# Altium footprint library 15-LEDs+LCD.PcbLib: 116 footprints (part 7 of 8)
Each footprint in its own frame and in the unit in brackets; x right, y up, seen from the top. Pads: shape width x height; smd on the part's side, far side on the other; paste and mask are expansions set on the pad; w line width, h text height; cw(c..) or ccw(c..) is an arc to the next point about the centre after c.
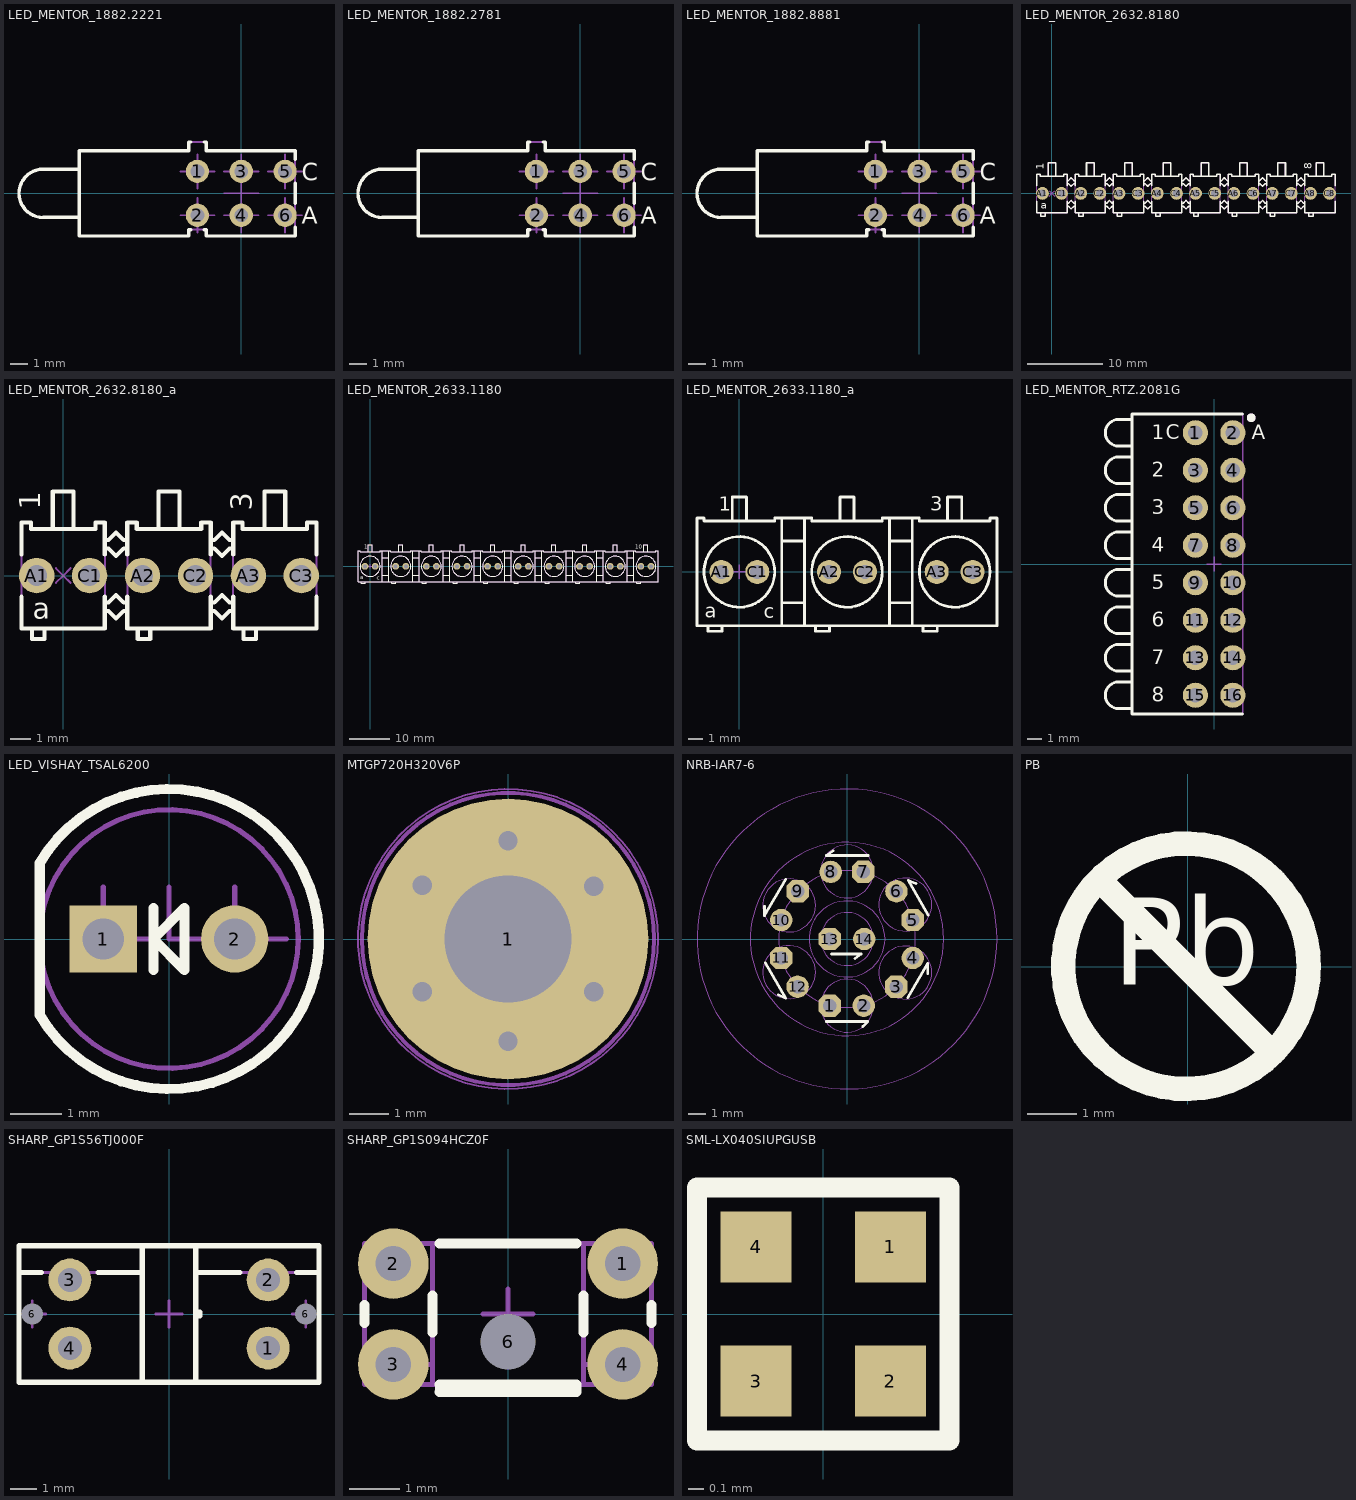
[diagram p6: the footprints below, top view; thin cyan lines are the x and y axes]

## LED_MENTOR_1882.2221 [mm] "3x Red LED 3mm PCB Edge Mounting MENTOR 1882.2221"
height 12
pads (6):
  round 1.35 hole 0.8: 1(-2.54,1.27) 2(-2.54,-1.27) 3(0,1.27) 4(0,-1.27) 5(2.54,1.27) 6(2.54,-1.27)
Top Overlay:
  lines w0.2: -9.38,-1.4 -11.48,-1.4 cw(c-11.48,0) -11.48,1.4 -9.38,1.4 ; -2.93,-2.1 -3.04,-2.1 -3.04,-2.475 -9.38,-2.475 -9.38,2.475 -3.04,2.475 -3.04,2.975 -2.93,2.975 ; -2.15,-2.1 -2.04,-2.1 -2.04,-2.475 3.12,-2.475 3.12,-1.958 ; -2.15,2.975 -2.04,2.975 -2.04,2.475 3.12,2.475 3.12,1.958 ; 3.12,-0.582 3.12,0.582
  text "C" at 3.505,0.762 h1
  text "A" at 3.505,-1.778 h1
Mechanical 8:
  lines w0.1: -3.54,-1.27 -2.54,-1.27 ; -3.54,1.27 -2.54,1.27 ; -2.54,-2.27 -2.54,-1.27 ; -2.54,-0.27 -2.54,-1.27 ; -2.54,0.27 -2.54,1.27 ; -2.54,2.27 -2.54,1.27 ; -1.54,-1.27 -2.54,-1.27 ; -1.54,1.27 -2.54,1.27 ; -1,-1.27 0,-1.27 ; -1,0 0,0 ; -1,1.27 0,1.27 ; 0,-2.27 0,-1.27 ; 0,-1 0,0 ; 0,1 0,0 ; 0,2.27 0,1.27 ; 1,-1.27 0,-1.27 ; 1,0 0,0 ; 1,1.27 0,1.27 ; 1.54,-1.27 2.54,-1.27 ; 1.54,1.27 2.54,1.27 ; 2.54,-2.27 2.54,-1.27 ; 2.54,-0.27 2.54,-1.27 ; 2.54,0.27 2.54,1.27 ; 2.54,2.27 2.54,1.27 ; 3.54,-1.27 2.54,-1.27 ; 3.54,1.27 2.54,1.27
Mechanical 14:
  lines w0.1: -9.38,-1.4 -11.48,-1.4 cw(c-11.48,0) -11.48,1.4 -9.38,1.4 ; -9.38,-2.475 -9.38,2.475 -3.04,2.475 -3.04,2.975 -2.04,2.975 -2.04,2.475 3.12,2.475 3.12,-2.475 -2.04,-2.475 -2.04,-2.1 -3.04,-2.1 -3.04,-2.475 -9.38,-2.475
  text "C" at 3.505,0.762 h1
  text "A" at 3.505,-1.778 h1
3D body "LED_MENTOR_1882.2221.stp": height 12, standoff -3.2, extent -12.88,-2.475 3.12,2.975

## LED_MENTOR_1882.2781 [mm] "3x LED 3mm (Red+Yellow +Green) PCB Edge Mounting MENTOR 1882.2781"
height 12
pads (6):
  round 1.35 hole 0.8: 1(-2.54,1.27) 2(-2.54,-1.27) 3(0,1.27) 4(0,-1.27) 5(2.54,1.27) 6(2.54,-1.27)
Top Overlay:
  lines w0.2: -9.38,-1.4 -11.48,-1.4 cw(c-11.48,0) -11.48,1.4 -9.38,1.4 ; -2.93,-2.1 -3.04,-2.1 -3.04,-2.475 -9.38,-2.475 -9.38,2.475 -3.04,2.475 -3.04,2.975 -2.93,2.975 ; -2.15,-2.1 -2.04,-2.1 -2.04,-2.475 3.12,-2.475 3.12,-1.958 ; -2.15,2.975 -2.04,2.975 -2.04,2.475 3.12,2.475 3.12,1.958 ; 3.12,-0.582 3.12,0.582
  text "C" at 3.505,0.762 h1
  text "A" at 3.505,-1.778 h1
Mechanical 8:
  lines w0.1: -3.54,-1.27 -2.54,-1.27 ; -3.54,1.27 -2.54,1.27 ; -2.54,-2.27 -2.54,-1.27 ; -2.54,-0.27 -2.54,-1.27 ; -2.54,0.27 -2.54,1.27 ; -2.54,2.27 -2.54,1.27 ; -1.54,-1.27 -2.54,-1.27 ; -1.54,1.27 -2.54,1.27 ; -1,-1.27 0,-1.27 ; -1,0 0,0 ; -1,1.27 0,1.27 ; 0,-2.27 0,-1.27 ; 0,-1 0,0 ; 0,1 0,0 ; 0,2.27 0,1.27 ; 1,-1.27 0,-1.27 ; 1,0 0,0 ; 1,1.27 0,1.27 ; 1.54,-1.27 2.54,-1.27 ; 1.54,1.27 2.54,1.27 ; 2.54,-2.27 2.54,-1.27 ; 2.54,-0.27 2.54,-1.27 ; 2.54,0.27 2.54,1.27 ; 2.54,2.27 2.54,1.27 ; 3.54,-1.27 2.54,-1.27 ; 3.54,1.27 2.54,1.27
Mechanical 14:
  lines w0.1: -9.38,-1.4 -11.48,-1.4 cw(c-11.48,0) -11.48,1.4 -9.38,1.4 ; -9.38,-2.475 -9.38,2.475 -3.04,2.475 -3.04,2.975 -2.04,2.975 -2.04,2.475 3.12,2.475 3.12,-2.475 -2.04,-2.475 -2.04,-2.1 -3.04,-2.1 -3.04,-2.475 -9.38,-2.475
  text "C" at 3.505,0.762 h1
  text "A" at 3.505,-1.778 h1
3D body "LED_MENTOR_1882.2781.stp": height 12, standoff -3.2, extent -12.88,-2.475 3.12,2.975

## LED_MENTOR_1882.8881 [mm] "3x Green LED 3mm PCB Edge Mounting MENTOR 1882.8881"
height 12
pads (6):
  round 1.35 hole 0.8: 1(-2.54,1.27) 2(-2.54,-1.27) 3(0,1.27) 4(0,-1.27) 5(2.54,1.27) 6(2.54,-1.27)
Top Overlay:
  lines w0.2: -9.38,-1.4 -11.48,-1.4 cw(c-11.48,0) -11.48,1.4 -9.38,1.4 ; -2.93,-2.1 -3.04,-2.1 -3.04,-2.475 -9.38,-2.475 -9.38,2.475 -3.04,2.475 -3.04,2.975 -2.93,2.975 ; -2.15,-2.1 -2.04,-2.1 -2.04,-2.475 3.12,-2.475 3.12,-1.958 ; -2.15,2.975 -2.04,2.975 -2.04,2.475 3.12,2.475 3.12,1.958 ; 3.12,-0.582 3.12,0.582
  text "A" at 3.505,-1.778 h1
  text "C" at 3.505,0.762 h1
Mechanical 8:
  lines w0.1: -3.54,-1.27 -2.54,-1.27 ; -3.54,1.27 -2.54,1.27 ; -2.54,-2.27 -2.54,-1.27 ; -2.54,-0.27 -2.54,-1.27 ; -2.54,0.27 -2.54,1.27 ; -2.54,2.27 -2.54,1.27 ; -1.54,-1.27 -2.54,-1.27 ; -1.54,1.27 -2.54,1.27 ; -1,-1.27 0,-1.27 ; -1,0 0,0 ; -1,1.27 0,1.27 ; 0,-2.27 0,-1.27 ; 0,-1 0,0 ; 0,1 0,0 ; 0,2.27 0,1.27 ; 1,-1.27 0,-1.27 ; 1,0 0,0 ; 1,1.27 0,1.27 ; 1.54,-1.27 2.54,-1.27 ; 1.54,1.27 2.54,1.27 ; 2.54,-2.27 2.54,-1.27 ; 2.54,-0.27 2.54,-1.27 ; 2.54,0.27 2.54,1.27 ; 2.54,2.27 2.54,1.27 ; 3.54,-1.27 2.54,-1.27 ; 3.54,1.27 2.54,1.27
Mechanical 14:
  lines w0.1: -9.38,-1.4 -11.48,-1.4 cw(c-11.48,0) -11.48,1.4 -9.38,1.4 ; -9.38,-2.475 -3.04,-2.475 -3.04,-2.1 -2.04,-2.1 -2.04,-2.475 3.12,-2.475 3.12,2.475 -2.04,2.475 -2.04,2.975 -3.04,2.975 -3.04,2.475 -9.38,2.475 -9.38,-2.475
  text "A" at 3.505,-1.778 h1
  text "C" at 3.505,0.762 h1
3D body "LED_MENTOR_1882.8881.stp": height 12, standoff -3.2, extent -12.88,-2.475 3.12,2.975

## LED_MENTOR_2632.8180 [mm] "8x Diameter 3mm Green LED Vertical LED Array"
height 13.3
pads (16):
  round 1.7 hole 1: A1(-1.27,0) A2(3.81,0) A3(8.89,0) A4(13.97,0) A5(19.05,0) A6(24.13,0) A7(29.21,0) A8(34.29,0) C1(1.27,0) C2(6.35,0) C3(11.43,0) C4(16.51,0) C5(21.59,0) C6(26.67,0) C7(31.75,0) C8(36.83,0)
Top Overlay:
  drawing of 240 lines, arcs and shapes, not listed
  text "8" at 34.455,3.2 h1
  text "1" at -1.105,3.15 h1
  text "a" at -1.462,-2.063 h1
Mechanical 8:
  lines w0.1: -1.77,0 -1.27,0 ; -1.27,-0.5 -1.27,0 ; -1.27,0.5 -1.27,0 ; -0.77,0 -1.27,0 ; -0.353,-0.354 0,0 ; -0.353,0.354 0,0 ; 0.354,-0.354 0,0 ; 0.354,0.354 0,0 ; 0.77,0 1.27,0 ; 1.27,-0.5 1.27,0 ; 1.27,0.5 1.27,0 ; 1.77,0 1.27,0 ; 3.31,0 3.81,0 ; 3.81,-0.5 3.81,0 ; 3.81,0.5 3.81,0 ; 4.31,0 3.81,0 ; 5.85,0 6.35,0 ; 6.35,-0.5 6.35,0 ; 6.35,0.5 6.35,0 ; 6.85,0 6.35,0 ; 8.39,0 8.89,0 ; 8.89,-0.5 8.89,0 ; 8.89,0.5 8.89,0 ; 9.39,0 8.89,0 ; 10.93,0 11.43,0 ; 11.43,-0.5 11.43,0 ; 11.43,0.5 11.43,0 ; 11.93,0 11.43,0 ; 13.47,0 13.97,0 ; 13.97,-0.5 13.97,0 ; 13.97,0.5 13.97,0 ; 14.47,0 13.97,0 ; 16.01,0 16.51,0 ; 16.51,-0.5 16.51,0 ; 16.51,0.5 16.51,0 ; 17.01,0 16.51,0 ; 18.55,0 19.05,0 ; 19.05,-0.5 19.05,0 ; 19.05,0.5 19.05,0 ; 19.55,0 19.05,0 ; 21.09,0 21.59,0 ; 21.59,-0.5 21.59,0 ; 21.59,0.5 21.59,0 ; 22.09,0 21.59,0 ; 23.63,0 24.13,0 ; 24.13,-0.5 24.13,0 ; 24.13,0.5 24.13,0 ; 24.63,0 24.13,0 ; 26.17,0 26.67,0 ; 26.67,-0.5 26.67,0 ; 26.67,0.5 26.67,0 ; 27.17,0 26.67,0 ; 28.71,0 29.21,0 ; 29.21,-0.5 29.21,0 ; 29.21,0.5 29.21,0 ; 29.71,0 29.21,0 ; 31.25,0 31.75,0 ; 31.75,-0.5 31.75,0 ; 31.75,0.5 31.75,0 ; 32.25,0 31.75,0 ; 33.79,0 34.29,0 ; 34.29,-0.5 34.29,0 ; 34.29,0.5 34.29,0 ; 34.79,0 34.29,0 ; 36.33,0 36.83,0 ; 36.83,-0.5 36.83,0 ; 36.83,0.5 36.83,0 ; 37.33,0 36.83,0
Mechanical 14:
  drawing of 224 lines, arcs and shapes, not listed
  text "8" at 34.455,3.2 h1
  text "1" at -1.105,3.15 h1
  text "a" at -1.462,-2.063 h1
3D body "LED_MENTOR_2632.8180.stp": height 13.3, standoff -3.2, extent -2,-3.04 37.56,4.04

## LED_MENTOR_2632.8180_a [mm] "3 LED of a Vertical Array of 8 Green 3mm LED"
height 13.3
pads (6):
  round 1.7 hole 1: A1(-1.27,0) A2(3.81,0) A3(8.89,0) C1(1.27,0) C2(6.35,0) C3(11.43,0)
Top Overlay:
  lines w0.2: -2,-1.015 -2,-2.54 2,-2.54 2,-1.015 ; -2,1.015 -2,2.54 -1.55,2.54 -1.55,2.24 1.55,2.24 1.55,2.54 2,2.54 2,1.015 ; -1.5,-2.54 -1.5,-3.04 -0.9,-3.04 -0.9,-2.54 ; -0.5,2.24 -0.5,4.04 0.5,4.04 0.5,2.24 ; 2,-1.7 2.174,-1.7 2.54,-2.066 2.906,-1.7 3.08,-1.7 ; 2,-1.3 2.174,-1.3 2.54,-0.934 2.906,-1.3 3.08,-1.3 ; 2,1.3 2.174,1.3 2.54,0.934 2.906,1.3 3.08,1.3 ; 2,1.7 2.174,1.7 2.54,2.066 2.906,1.7 3.08,1.7 ; 3.08,-1.015 3.08,-2.54 7.08,-2.54 7.08,-1.015 ; 3.08,1.015 3.08,2.54 3.53,2.54 3.53,2.24 6.63,2.24 6.63,2.54 7.08,2.54 7.08,1.015 ; 3.58,-2.54 3.58,-3.04 4.18,-3.04 4.18,-2.54 ; 4.58,2.24 4.58,4.04 5.58,4.04 5.58,2.24 ; 7.08,-1.7 7.254,-1.7 7.62,-2.066 7.986,-1.7 8.16,-1.7 ; 7.08,-1.3 7.254,-1.3 7.62,-0.934 7.986,-1.3 8.16,-1.3 ; 7.08,1.3 7.254,1.3 7.62,0.934 7.986,1.3 8.16,1.3 ; 7.08,1.7 7.254,1.7 7.62,2.066 7.986,1.7 8.16,1.7 ; 8.16,-1.015 8.16,-2.54 12.16,-2.54 12.16,-1.015 ; 8.16,1.015 8.16,2.54 8.61,2.54 8.61,2.24 11.71,2.24 11.71,2.54 12.16,2.54 12.16,1.015 ; 8.66,-2.54 8.66,-3.04 9.26,-3.04 9.26,-2.54 ; 9.66,2.24 9.66,4.04 10.66,4.04 10.66,2.24
  text "3" at 9.055,3.11 h1
  text "a" at -1.462,-2.063 h1
  text "1" at -1.105,3.15 h1
Mechanical 8:
  lines w0.1: -1.77,0 -1.27,0 ; -1.27,-0.5 -1.27,0 ; -1.27,0.5 -1.27,0 ; -0.77,0 -1.27,0 ; -0.353,-0.354 0,0 ; -0.353,0.354 0,0 ; 0.354,-0.354 0,0 ; 0.354,0.354 0,0 ; 0.77,0 1.27,0 ; 1.27,-0.5 1.27,0 ; 1.27,0.5 1.27,0 ; 1.77,0 1.27,0 ; 3.31,0 3.81,0 ; 3.81,-0.5 3.81,0 ; 3.81,0.5 3.81,0 ; 4.31,0 3.81,0 ; 5.85,0 6.35,0 ; 6.35,-0.5 6.35,0 ; 6.35,0.5 6.35,0 ; 6.85,0 6.35,0 ; 8.39,0 8.89,0 ; 8.89,-0.5 8.89,0 ; 8.89,0.5 8.89,0 ; 9.39,0 8.89,0 ; 10.93,0 11.43,0 ; 11.43,-0.5 11.43,0 ; 11.43,0.5 11.43,0 ; 11.93,0 11.43,0
Mechanical 14:
  lines w0.1: -1.5,-2.54 -1.5,-3.04 -0.9,-3.04 -0.9,-2.54 ; -0.5,2.24 -0.5,4.04 0.5,4.04 0.5,2.24 ; 2,-1.7 2.174,-1.7 2.54,-2.066 2.906,-1.7 3.08,-1.7 ; 2,-1.3 2.174,-1.3 2.54,-0.934 2.906,-1.3 3.08,-1.3 ; 2,1.3 2.174,1.3 2.54,0.934 2.906,1.3 3.08,1.3 ; 2,1.7 2.174,1.7 2.54,2.066 2.906,1.7 3.08,1.7 ; 3.58,-2.54 3.58,-3.04 4.18,-3.04 4.18,-2.54 ; 4.58,2.24 4.58,4.04 5.58,4.04 5.58,2.24 ; 7.08,-1.7 7.254,-1.7 7.62,-2.066 7.986,-1.7 8.16,-1.7 ; 7.08,-1.3 7.254,-1.3 7.62,-0.934 7.986,-1.3 8.16,-1.3 ; 7.08,1.3 7.254,1.3 7.62,0.934 7.986,1.3 8.16,1.3 ; 7.08,1.7 7.254,1.7 7.62,2.066 7.986,1.7 8.16,1.7 ; 8.66,-2.54 8.66,-3.04 9.26,-3.04 9.26,-2.54 ; 9.66,2.24 9.66,4.04 10.66,4.04 10.66,2.24 ; -2,-2.54 -2,2.54 -1.55,2.54 -1.55,2.24 1.55,2.24 1.55,2.54 2,2.54 2,-2.54 -2,-2.54 ; 3.08,-2.54 3.08,2.54 3.53,2.54 3.53,2.24 6.63,2.24 6.63,2.54 7.08,2.54 7.08,-2.54 3.08,-2.54 ; 8.16,-2.54 8.16,2.54 8.61,2.54 8.61,2.24 11.71,2.24 11.71,2.54 12.16,2.54 12.16,-2.54 8.16,-2.54
  text "3" at 9.055,3.11 h1
  text "a" at -1.462,-2.063 h1
  text "1" at -1.105,3.15 h1
3D body "LED_MENTOR_2632.8180_a.stp": height 13.3, standoff -3.2, extent -2,-3.04 12.16,4.04

## LED_MENTOR_2633.1180 [mm] "10x Diameter 5mm Green LED Vertical LED Array"
height 17.1
pads (20):
  round 1.7 hole 1: A1(-1.27,0) A2(6.35,0) A3(13.97,0) A4(21.59,0) A5(29.21,0) A6(36.83,0) A7(44.45,0) A8(52.07,0) A9(59.69,0) A10(67.31,0) C1(1.27,0) C2(8.89,0) C3(16.51,0) C4(24.13,0) C5(31.75,0) C6(39.37,0) C7(46.99,0) C8(54.61,0) C9(62.23,0) C10(69.85,0)
Top Overlay:
  drawing of 159 lines, arcs and shapes, not listed
  text "a" at -2.457,-3.263 h1
  text "1" at -1.45,4.325 h1
  text "10" at 65.973,4.362 h1
  text "c" at 1.723,-3.288 h1
Mechanical 8:
  lines w0.1: -1.77,0 -1.27,0 ; -1.27,-0.5 -1.27,0 ; -1.27,0.5 -1.27,0 ; -0.77,0 -1.27,0 ; -0.5,0 0,0 ; 0,-0.5 0,0 ; 0,0.5 0,0 ; 0.5,0 0,0 ; 0.77,0 1.27,0 ; 1.27,-0.5 1.27,0 ; 1.27,0.5 1.27,0 ; 1.77,0 1.27,0 ; 5.85,0 6.35,0 ; 6.35,-0.5 6.35,0 ; 6.35,0.5 6.35,0 ; 6.85,0 6.35,0 ; 8.39,0 8.89,0 ; 8.89,-0.5 8.89,0 ; 8.89,0.5 8.89,0 ; 9.39,0 8.89,0 ; 13.47,0 13.97,0 ; 13.97,-0.5 13.97,0 ; 13.97,0.5 13.97,0 ; 14.47,0 13.97,0 ; 16.01,0 16.51,0 ; 16.51,-0.5 16.51,0 ; 16.51,0.5 16.51,0 ; 17.01,0 16.51,0 ; 21.09,0 21.59,0 ; 21.59,-0.5 21.59,0 ; 21.59,0.5 21.59,0 ; 22.09,0 21.59,0 ; 23.63,0 24.13,0 ; 24.13,-0.5 24.13,0 ; 24.13,0.5 24.13,0 ; 24.63,0 24.13,0 ; 28.71,0 29.21,0 ; 29.21,-0.5 29.21,0 ; 29.21,0.5 29.21,0 ; 29.71,0 29.21,0 ; 31.25,0 31.75,0 ; 31.75,-0.5 31.75,0 ; 31.75,0.5 31.75,0 ; 32.25,0 31.75,0 ; 36.33,0 36.83,0 ; 36.83,-0.5 36.83,0 ; 36.83,0.5 36.83,0 ; 37.33,0 36.83,0 ; 38.87,0 39.37,0 ; 39.37,-0.5 39.37,0 ; 39.37,0.5 39.37,0 ; 39.87,0 39.37,0 ; 43.95,0 44.45,0 ; 44.45,-0.5 44.45,0 ; 44.45,0.5 44.45,0 ; 44.95,0 44.45,0 ; 46.49,0 46.99,0 ; 46.99,-0.5 46.99,0 ; 46.99,0.5 46.99,0 ; 47.49,0 46.99,0 ; 51.57,0 52.07,0 ; 52.07,-0.5 52.07,0 ; 52.07,0.5 52.07,0 ; 52.57,0 52.07,0 ; 54.11,0 54.61,0 ; 54.61,-0.5 54.61,0 ; 54.61,0.5 54.61,0 ; 55.11,0 54.61,0 ; 59.19,0 59.69,0 ; 59.69,-0.5 59.69,0 ; 59.69,0.5 59.69,0 ; 60.19,0 59.69,0 ; 61.73,0 62.23,0 ; 62.23,-0.5 62.23,0 ; 62.23,0.5 62.23,0 ; 62.73,0 62.23,0 ; 66.81,0 67.31,0 ; 67.31,-0.5 67.31,0 ; 67.31,0.5 67.31,0 ; 67.81,0 67.31,0 ; 69.35,0 69.85,0 ; 69.85,-0.5 69.85,0 ; 69.85,0.5 69.85,0 ; 70.35,0 69.85,0
Mechanical 14:
  drawing of 159 lines, arcs and shapes, not listed
  text "a" at -2.457,-3.263 h1
  text "1" at -1.45,4.325 h1
  text "10" at 65.973,4.362 h1
  text "c" at 1.723,-3.288 h1
3D body "LED_MENTOR_2633.1180.stp": height 17.1, standoff -3.2, extent -3,-4.21 71.58,5.31

## LED_MENTOR_2633.1180_a [mm] "3 LED of a Vertical Array of 10 Green 5mm LED"
height 17.1
pads (6):
  round 1.7 hole 1: A1(-1.27,0) A2(6.35,0) A3(13.97,0) C1(1.27,0) C2(8.89,0) C3(16.51,0)
Top Overlay:
  circle w0.2: c0,0 r2.5
  circle w0.2: c7.62,0 r2.5
  circle w0.2: c15.24,0 r2.5
  lines w0.2: -2.23,-3.81 -2.23,-4.21 -1.23,-4.21 -1.23,-3.81 ; -0.5,3.61 -0.5,5.31 0.5,5.31 0.5,3.61 ; 3,-3.81 3,3.81 ; 3,-2.19 4.62,-2.19 ; 3,2.19 4.62,2.19 ; 4.62,-3.81 4.62,3.81 ; 5.39,-3.81 5.39,-4.21 6.39,-4.21 6.39,-3.81 ; 7.12,3.61 7.12,5.31 8.12,5.31 8.12,3.61 ; 10.62,-3.81 10.62,3.81 ; 10.62,-2.19 12.24,-2.19 ; 10.62,2.19 12.24,2.19 ; 12.24,-3.81 12.24,3.81 ; 13.01,-3.81 13.01,-4.21 14.01,-4.21 14.01,-3.81 ; 14.74,3.61 14.74,5.31 15.74,5.31 15.74,3.61 ; -2.5,3.61 -2.5,3.81 ; -2.5,3.61 2.5,3.61 2.5,3.81 5.12,3.81 ; -2.5,3.61 -2.5,3.81 ; -2.5,3.81 -3,3.81 -3,-3.81 18.24,-3.81 18.24,3.81 17.74,3.81 17.74,3.61 12.74,3.61 ; 5.12,3.61 5.12,3.81 ; 5.12,3.61 10.12,3.61 10.12,3.81 12.74,3.81 ; 5.12,3.61 5.12,3.81 ; 12.74,3.61 12.74,3.81 ; 12.74,3.61 12.74,3.81
  text "3" at 13.525,4.325 h1
  text "1" at -1.45,4.325 h1
  text "c" at 1.723,-3.288 h1
  text "a" at -2.457,-3.263 h1
Mechanical 8:
  lines w0.1: -1.77,0 -1.27,0 ; -1.27,-0.5 -1.27,0 ; -1.27,0.5 -1.27,0 ; -0.77,0 -1.27,0 ; -0.5,0 0,0 ; 0,-0.5 0,0 ; 0,0.5 0,0 ; 0.5,0 0,0 ; 0.77,0 1.27,0 ; 1.27,-0.5 1.27,0 ; 1.27,0.5 1.27,0 ; 1.77,0 1.27,0 ; 5.85,0 6.35,0 ; 6.35,-0.5 6.35,0 ; 6.35,0.5 6.35,0 ; 6.85,0 6.35,0 ; 8.39,0 8.89,0 ; 8.89,-0.5 8.89,0 ; 8.89,0.5 8.89,0 ; 9.39,0 8.89,0 ; 13.47,0 13.97,0 ; 13.97,-0.5 13.97,0 ; 13.97,0.5 13.97,0 ; 14.47,0 13.97,0 ; 16.01,0 16.51,0 ; 16.51,-0.5 16.51,0 ; 16.51,0.5 16.51,0 ; 17.01,0 16.51,0
Mechanical 14:
  circle w0.1: c0,0 r2.5
  circle w0.1: c7.62,0 r2.5
  circle w0.1: c15.24,0 r2.5
  lines w0.1: -2.23,-3.81 -2.23,-4.21 -1.23,-4.21 -1.23,-3.81 ; -0.5,3.61 -0.5,5.31 0.5,5.31 0.5,3.61 ; 3,-3.81 3,3.81 ; 3,-2.19 4.62,-2.19 ; 3,2.19 4.62,2.19 ; 4.62,-3.81 4.62,3.81 ; 5.39,-3.81 5.39,-4.21 6.39,-4.21 6.39,-3.81 ; 7.12,3.61 7.12,5.31 8.12,5.31 8.12,3.61 ; 10.62,-3.81 10.62,3.81 ; 10.62,-2.19 12.24,-2.19 ; 10.62,2.19 12.24,2.19 ; 12.24,-3.81 12.24,3.81 ; 13.01,-3.81 13.01,-4.21 14.01,-4.21 14.01,-3.81 ; 14.74,3.61 14.74,5.31 15.74,5.31 15.74,3.61 ; -2.5,3.61 -2.5,3.81 ; -2.5,3.61 2.5,3.61 2.5,3.81 5.12,3.81 ; -2.5,3.61 -2.5,3.81 ; -2.5,3.81 -3,3.81 -3,-3.81 18.24,-3.81 18.24,3.81 17.74,3.81 17.74,3.61 12.74,3.61 ; 5.12,3.61 5.12,3.81 ; 5.12,3.61 10.12,3.61 10.12,3.81 12.74,3.81 ; 5.12,3.61 5.12,3.81 ; 12.74,3.61 12.74,3.81 ; 12.74,3.61 12.74,3.81
  text "3" at 13.525,4.325 h1
  text "1" at -1.45,4.325 h1
  text "c" at 1.723,-3.288 h1
  text "a" at -2.457,-3.263 h1
3D body "LED_MENTOR_2633.1180_a.stp": height 17.1, standoff -3.2, extent -3,-4.21 18.24,5.31

## LED_MENTOR_RTZ.2081G [mm] "8x Diametre 2mm Green LED Horizontal LED Array"
height 5.08
pads (16):
  round 1.7 hole 1: 1(-1.27,8.89) 2(1.27,8.89) 3(-1.27,6.35) 4(1.27,6.35) 5(-1.27,3.81) 6(1.27,3.81) 7(-1.27,1.27) 8(1.27,1.27) 9(-1.27,-1.27) 10(1.27,-1.27) 11(-1.27,-3.81) 12(1.27,-3.81) 13(-1.27,-6.35) 14(1.27,-6.35) 15(-1.27,-8.89) 16(1.27,-8.89)
Top Overlay:
  circle w0.3: c2.517,9.906 r0.15
  lines w0.2: -5.57,-9.79 -6.47,-9.79 cw(c-6.47,-8.89) -6.47,-7.99 -5.57,-7.99 ; -5.57,-7.25 -6.47,-7.25 cw(c-6.47,-6.35) -6.47,-5.45 -5.57,-5.45 ; -5.57,-4.71 -6.47,-4.71 cw(c-6.47,-3.81) -6.47,-2.91 -5.57,-2.91 ; -5.57,-2.17 -6.47,-2.17 cw(c-6.47,-1.27) -6.47,-0.37 -5.57,-0.37 ; -5.57,0.37 -6.47,0.37 cw(c-6.47,1.27) -6.47,2.17 -5.57,2.17 ; -5.57,2.91 -6.47,2.91 cw(c-6.47,3.81) -6.47,4.71 -5.57,4.71 ; -5.57,5.45 -6.47,5.45 cw(c-6.47,6.35) -6.47,7.25 -5.57,7.25 ; -5.57,7.99 -6.47,7.99 cw(c-6.47,8.89) -6.47,9.79 -5.57,9.79 ; 1.93,-10.16 -5.57,-10.16 -5.57,10.16 1.93,10.16
  text "C" at -3.279,8.455 h1
  text "A" at 2.563,8.452 h1
  text "1" at -4.227,8.455 h1
  text "2" at -4.227,5.915 h1
  text "3" at -4.227,3.375 h1
  text "4" at -4.227,0.835 h1
  text "5" at -4.227,-1.705 h1
  text "6" at -4.227,-4.245 h1
  text "7" at -4.227,-6.785 h1
  text "8" at -4.227,-9.325 h1
Mechanical 8:
  lines w0.1: -1.77,-8.89 -1.27,-8.89 ; -1.77,-6.35 -1.27,-6.35 ; -1.77,-3.81 -1.27,-3.81 ; -1.77,-1.27 -1.27,-1.27 ; -1.77,1.27 -1.27,1.27 ; -1.77,3.81 -1.27,3.81 ; -1.77,6.35 -1.27,6.35 ; -1.77,8.89 -1.27,8.89 ; -1.27,-9.39 -1.27,-8.89 ; -1.27,-8.39 -1.27,-8.89 ; -1.27,-6.85 -1.27,-6.35 ; -1.27,-5.85 -1.27,-6.35 ; -1.27,-4.31 -1.27,-3.81 ; -1.27,-3.31 -1.27,-3.81 ; -1.27,-1.77 -1.27,-1.27 ; -1.27,-0.77 -1.27,-1.27 ; -1.27,0.77 -1.27,1.27 ; -1.27,1.77 -1.27,1.27 ; -1.27,3.31 -1.27,3.81 ; -1.27,4.31 -1.27,3.81 ; -1.27,5.85 -1.27,6.35 ; -1.27,6.85 -1.27,6.35 ; -1.27,8.39 -1.27,8.89 ; -1.27,9.39 -1.27,8.89 ; -0.77,-8.89 -1.27,-8.89 ; -0.77,-6.35 -1.27,-6.35 ; -0.77,-3.81 -1.27,-3.81 ; -0.77,-1.27 -1.27,-1.27 ; -0.77,1.27 -1.27,1.27 ; -0.77,3.81 -1.27,3.81 ; -0.77,6.35 -1.27,6.35 ; -0.77,8.89 -1.27,8.89 ; -0.5,0 0,0 ; 0,-0.5 0,0 ; 0,0.5 0,0 ; 0.5,0 0,0 ; 0.77,-8.89 1.27,-8.89 ; 0.77,-6.35 1.27,-6.35 ; 0.77,-3.81 1.27,-3.81 ; 0.77,-1.27 1.27,-1.27 ; 0.77,1.27 1.27,1.27 ; 0.77,3.81 1.27,3.81 ; 0.77,6.35 1.27,6.35 ; 0.77,8.89 1.27,8.89 ; 1.27,-9.39 1.27,-8.89 ; 1.27,-8.39 1.27,-8.89 ; 1.27,-6.85 1.27,-6.35 ; 1.27,-5.85 1.27,-6.35 ; 1.27,-4.31 1.27,-3.81 ; 1.27,-3.31 1.27,-3.81 ; 1.27,-1.77 1.27,-1.27 ; 1.27,-0.77 1.27,-1.27 ; 1.27,0.77 1.27,1.27 ; 1.27,1.77 1.27,1.27 ; 1.27,3.31 1.27,3.81 ; 1.27,4.31 1.27,3.81 ; 1.27,5.85 1.27,6.35 ; 1.27,6.85 1.27,6.35 ; 1.27,8.39 1.27,8.89 ; 1.27,9.39 1.27,8.89 ; 1.77,-8.89 1.27,-8.89 ; 1.77,-6.35 1.27,-6.35 ; 1.77,-3.81 1.27,-3.81 ; 1.77,-1.27 1.27,-1.27 ; 1.77,1.27 1.27,1.27 ; 1.77,3.81 1.27,3.81 ; 1.77,6.35 1.27,6.35 ; 1.77,8.89 1.27,8.89
Mechanical 14:
  circle w0.3: c2.517,9.906 r0.15
  lines w0.1: -5.57,-9.79 -6.47,-9.79 cw(c-6.47,-8.89) -6.47,-7.99 -5.57,-7.99 ; -5.57,-7.25 -6.47,-7.25 cw(c-6.47,-6.35) -6.47,-5.45 -5.57,-5.45 ; -5.57,-4.71 -6.47,-4.71 cw(c-6.47,-3.81) -6.47,-2.91 -5.57,-2.91 ; -5.57,-2.17 -6.47,-2.17 cw(c-6.47,-1.27) -6.47,-0.37 -5.57,-0.37 ; -5.57,0.37 -6.47,0.37 cw(c-6.47,1.27) -6.47,2.17 -5.57,2.17 ; -5.57,2.91 -6.47,2.91 cw(c-6.47,3.81) -6.47,4.71 -5.57,4.71 ; -5.57,5.45 -6.47,5.45 cw(c-6.47,6.35) -6.47,7.25 -5.57,7.25 ; -5.57,7.99 -6.47,7.99 cw(c-6.47,8.89) -6.47,9.79 -5.57,9.79 ; -5.57,-10.16 1.93,-10.16 1.93,10.16 -5.57,10.16 -5.57,-10.16
  text "C" at -3.279,8.455 h1
  text "A" at 2.563,8.452 h1
  text "1" at -4.227,8.455 h1
  text "2" at -4.227,5.915 h1
  text "3" at -4.227,3.375 h1
  text "4" at -4.227,0.835 h1
  text "5" at -4.227,-1.705 h1
  text "6" at -4.227,-4.245 h1
  text "7" at -4.227,-6.785 h1
  text "8" at -4.227,-9.325 h1
3D body "LED_MENTOR_RTZ.2081G.stp": height 5.08, standoff -3.3, extent -7.37,-10.16 1.93,10.16

## LED_VISHAY_TSAL6200 [mm] "5mm Infrared Emitting Diode, VISHAY TSAL"
height 13.7
pads (2):
  rect 1.3x1.3 hole 0.8: 1(-1.27,0)
  round 1.3 hole 0.8: 2(1.27,0)
Top Overlay:
  lines w0.2: -0.3,-0.6 -0.3,0.6 ; -2.5,-1.47 ccw(c0,0) -2.5,1.47 -2.5,-1.47 ; -0.3,0 0.3,-0.6 0.3,0.6 -0.3,0
Mechanical 8:
  lines w0.1: -1.27,1 -1.27,0 -0.27,0 ; 0,1 0,0 1,0 ; 1.27,1 1.27,0 2.27,0 ; -1.52,-0.25 -1.52,0.25 -1.02,0.25 -1.02,-0.25 -1.52,-0.25 ; 1.02,-0.25 1.02,0.25 1.52,0.25 1.52,-0.25 1.02,-0.25
  text "C" at -1.651,1 h1
  text "A" at 0.913,1 h1
Mechanical 14:
  circle w0.1: c0,0 r2.5
  lines w0.1: -0.3,-0.6 -0.3,0.6 ; -2.5,-1.47 ccw(c0,0) -2.5,1.47 -2.5,-1.47 ; -0.3,0 0.3,0.6 0.3,-0.6 -0.3,0
3D body "LED_VISHAY_TSAL6200.stp": height 13.7, standoff -3.1, extent -2.5,-2.9 2.9,2.9

## MTGP720H320V6P [mm]
pads (1):
  round 7.2 hole 3.25: 1(0,0)
via 2.2,-1.35 diameter 1 hole 0.5
via 0,-2.625 diameter 1 hole 0.5
via 2.2,1.35 diameter 1 hole 0.5
via 0,2.525 diameter 1 hole 0.5
via -2.2,1.375 diameter 1 hole 0.5
via -2.2,-1.35 diameter 1 hole 0.5
Mechanical 8:
  circle w0.1: c0,0 r3.75
  circle w0.1: c0,0 r2.6
  lines w0.1: -2.657,1.625 -2.224,1.375 ; -2.632,-1.6 -2.199,-1.35 ; -2.474,0.942 -2.224,1.375 ; -2.449,-0.917 -2.199,-1.35 ; -1.974,1.808 -2.224,1.375 ; -1.949,-1.783 -2.199,-1.35 ; -1.791,1.125 -2.224,1.375 ; -1.766,-1.1 -2.199,-1.35 ; -0.5,-2.625 0,-2.625 ; -0.5,0 0,0 ; -0.5,2.525 0,2.525 ; 0,-3.125 0,-2.625 ; 0,-2.125 0,-2.625 ; 0,-0.5 0,0 ; 0,0.5 0,0 ; 0,2.025 0,2.525 ; 0,3.025 0,2.525 ; 0.5,-2.625 0,-2.625 ; 0.5,0 0,0 ; 0.5,2.525 0,2.525 ; 1.766,-1.1 2.199,-1.35 ; 1.766,1.1 2.199,1.35 ; 1.949,-1.783 2.199,-1.35 ; 1.949,1.783 2.199,1.35 ; 2.449,-0.917 2.199,-1.35 ; 2.449,0.917 2.199,1.35 ; 2.632,-1.6 2.199,-1.35 ; 2.632,1.6 2.199,1.35
Mechanical 14:
  circle w0.1: c0,0 r3.75
Mechanical 15:
  circle w0.05: c0,0 r3.85
3D body "mtgp720h320v6p.stp": height 0.1, standoff -1.75, extent -3.627,-3.627 3.628,3.628

## NRB-IAR7-6 [mm]
height 13.7
pads (14):
  oct 1.27x1.27 hole 0.762: 1(-0.975,-3.775) 3(2.8,-2.7) 5(3.725,1.075) 7(0.925,3.8) 9(-2.8,2.7) 11(-3.725,-1.075) 13(-0.975,0)
  round 1.27 hole 0.762: 2(0.95,-3.775) 4(3.725,-1.075) 6(2.8,2.7) 8(-0.925,3.8) 10(-3.725,1.075) 12(-2.8,-2.7) 14(0.975,0)
Top Overlay:
  lines w0.152: -4.675,1.85 -4.675,1.325 -3.475,3.375 ; -4.625,-1.35 -3.475,-3.35 -3.9,-3.15 ; -1.175,-4.675 1.175,-4.675 0.9,-4.95 ; -0.875,-0.85 0.8,-0.85 0.45,-1.1 ; -0.775,5 -1.175,4.725 1.2,4.725 ; 3.448,-3.324 4.575,-1.369 4.575,-1.975 ; 3.906,3.138 3.461,3.325 4.607,1.337
Mechanical 14:
  circle w0.002: c0,0 r3.877
  circle w0.025: c0,0 r2.152
  circle w0.025: c0,0 r1.5
  circle w0.025: c0,-3.775 r1.5
  circle w0.025: c3.3,-1.9 r1.5
  circle w0.025: c3.3,1.95 r1.5
  circle w0.025: c0,3.825 r1.5
  circle w0.025: c-3.275,1.9 r1.5
  circle w0.025: c-3.275,-1.875 r1.5
  circle w0.025: c0,0 r5.475
Mechanical 15:
  circle w0.025: c0,0 r8.493
3D body "iae7.stp": height 10.7, standoff 0, extent -8.469,-7.5 8.469,7.5

## PB [mm]
Top Overlay:
  circle w0.5: c-0.031,0.013 r2.5
  lines w0.5: -1.737,1.719 1.675,-1.693
  text "Pb" at -1.536,-0.948 h3.05
3D body "pb.stp": height 0.02, standoff 0, extent -2.725,-2.725 2.725,2.725

## PCBComponent_1 - duplicate [mm]

## SHARP_GP1S56TJ000F [mm] "Gap : 2mm, Slit : 0.15mm Phototransistor Output, Case package Transmissive Photointerrupter"
height 8.2
pads (6):
  round 1.6 hole 0.9: 1(3.7,-1.27) 2(3.7,1.27) 3(-3.7,1.27) 4(-3.7,-1.27)
  round 0.5 hole 0.8 unplated mask+0.15: 6(-5.1,0) 6(5.1,0)
Top Overlay:
  lines w0.2: -5.6,1.55 -4.764,1.55 ; -2.636,1.55 -1,1.55 ; -1,-2.55 -1,2.55 ; 1,-2.55 1,2.55 ; 1,-0.075 1.15,-0.075 1.15,0.075 1,0.075 ; 1,1.55 2.636,1.55 ; 4.764,1.55 5.6,1.55 ; -5.6,-2.55 -5.6,2.55 5.6,2.55 5.6,-2.55 -5.6,-2.55
Mechanical 8:
  lines w0.1: -5.6,0 -5.1,0 ; -5.1,-0.5 -5.1,0 ; -5.1,0.5 -5.1,0 ; -4.6,0 -5.1,0 ; -4.2,-1.27 -3.7,-1.27 ; -4.2,1.27 -3.7,1.27 ; -3.7,-1.77 -3.7,-1.27 ; -3.7,-0.77 -3.7,-1.27 ; -3.7,0.77 -3.7,1.27 ; -3.7,1.77 -3.7,1.27 ; -3.2,-1.27 -3.7,-1.27 ; -3.2,1.27 -3.7,1.27 ; -0.5,0 0,0 ; 0,-0.5 0,0 ; 0,0.5 0,0 ; 0.5,0 0,0 ; 3.2,-1.27 3.7,-1.27 ; 3.2,1.27 3.7,1.27 ; 3.7,-1.77 3.7,-1.27 ; 3.7,-0.77 3.7,-1.27 ; 3.7,0.77 3.7,1.27 ; 3.7,1.77 3.7,1.27 ; 4.2,-1.27 3.7,-1.27 ; 4.2,1.27 3.7,1.27 ; 4.6,0 5.1,0 ; 5.1,-0.5 5.1,0 ; 5.1,0.5 5.1,0 ; 5.6,0 5.1,0
Mechanical 14:
  lines w0.1: -5.6,1.55 -1,1.55 ; -1,-2.55 -1,2.55 ; 1,-2.55 1,2.55 ; 1,-0.075 1.15,-0.075 1.15,0.075 1,0.075 ; 1,1.55 5.6,1.55 ; -5.6,-2.55 -5.6,2.55 5.6,2.55 5.6,-2.55 -5.6,-2.55
3D body "SHARP_GP1S56TJ000F.stp": height 7.5, standoff -3.6, extent -5.6,-2.55 5.6,2.55

## SHARP_GP1S094HCZ0F [mm] "Gap : 3mm, Slit : 0.3mm Phototransistor Output, Compact Transmissive Photointerrupter"
height 4.8
pads (5):
  round 1.4 hole 0.7: 1(2.275,1) 2(-2.275,1) 3(-2.275,-1) 4(2.275,-1)
  round 1 hole 1.1 unplated mask+0.05: 6(0,-0.55)
Top Overlay:
  lines w0.2: -2.85,-0.182 -2.85,0.182 ; -1.358,-1.4 1.358,-1.4 1.358,-1.55 -1.358,-1.55 -1.35,-1.55 -1.35,-1.4 ; 1.5,-0.368 1.5,0.368 ; -1.5,-0.368 -1.5,0.368 -1.5,-0.368 ; -1.358,1.4 1.358,1.4 -1.358,1.4 ; 2.85,-0.182 2.85,0.182 2.85,-0.182
Mechanical 8:
  lines w0.1: -2.775,-1 -2.275,-1 ; -2.775,1 -2.275,1 ; -2.275,-1.5 -2.275,-1 ; -2.275,-0.5 -2.275,-1 ; -2.275,0.5 -2.275,1 ; -2.275,1.5 -2.275,1 ; -1.775,-1 -2.275,-1 ; -1.775,1 -2.275,1 ; -0.5,-0.55 0,-0.55 ; -0.5,0 0,0 ; 0,-1.05 0,-0.55 ; 0,0.5 0,0 ; 0.5,-0.55 0,-0.55 ; 0.5,0 0,0 ; 1.775,-1 2.275,-1 ; 1.775,1 2.275,1 ; 2.275,-1.5 2.275,-1 ; 2.275,-0.5 2.275,-1 ; 2.275,0.5 2.275,1 ; 2.275,1.5 2.275,1 ; 2.775,-1 2.275,-1 ; 2.775,1 2.275,1
Mechanical 14:
  lines w0.1: -2.85,-1 -1.5,-1 ; 1.5,-1.4 1.5,1.4 ; 1.5,-1 2.85,-1 ; -2.85,-1.4 2.85,-1.4 ; -2.85,-1.4 -2.85,1.4 ; -2.85,-1.4 2.85,-1.4 ; -2.85,-1.4 -2.85,1.4 ; -2.85,1.4 2.85,1.4 ; -2.85,1.4 2.85,1.4 ; 2.85,-1.4 2.85,1.4 ; 2.85,-1.4 2.85,1.4 ; -1.5,-1.4 -1.5,1.4 -1.5,-1.4
3D body "SHARP_GP1S094HCZ0F.stp": height 4.8, standoff -3.2, extent -2.85,-1.4 2.85,1.4

## SML-LX040SIUPGUSB [mm]
height 4.8
pads (4):
  rect 0.45x0.45 smd mask+0.07: 1(0.425,0.425) 2(0.425,-0.425) 3(-0.425,-0.425) 4(-0.425,0.425)
Top Overlay:
  lines w0.127: -0.8,-0.8 0.8,-0.8 0.8,0.8 -0.8,0.8 -0.8,-0.8
Top Solder:
  region: 0.9,0.3 0.9,0.6 1.1,0.6 1.1,0.3
3D body "sml-lx040siupgusb.stp": height 0.32, standoff 0, extent -0.5,-0.5 0.5,0.5